# Altium footprint library 排针排座.PcbLib: 344 footprints (part 18 of 22)
Each footprint in its own frame and in the unit in brackets; x right, y up, seen from the top. Pads: shape width x height; smd on the part's side, far side on the other; paste and mask are expansions set on the pad; w line width, h text height; cw(c..) or ccw(c..) is an arc to the next point about the centre after c.
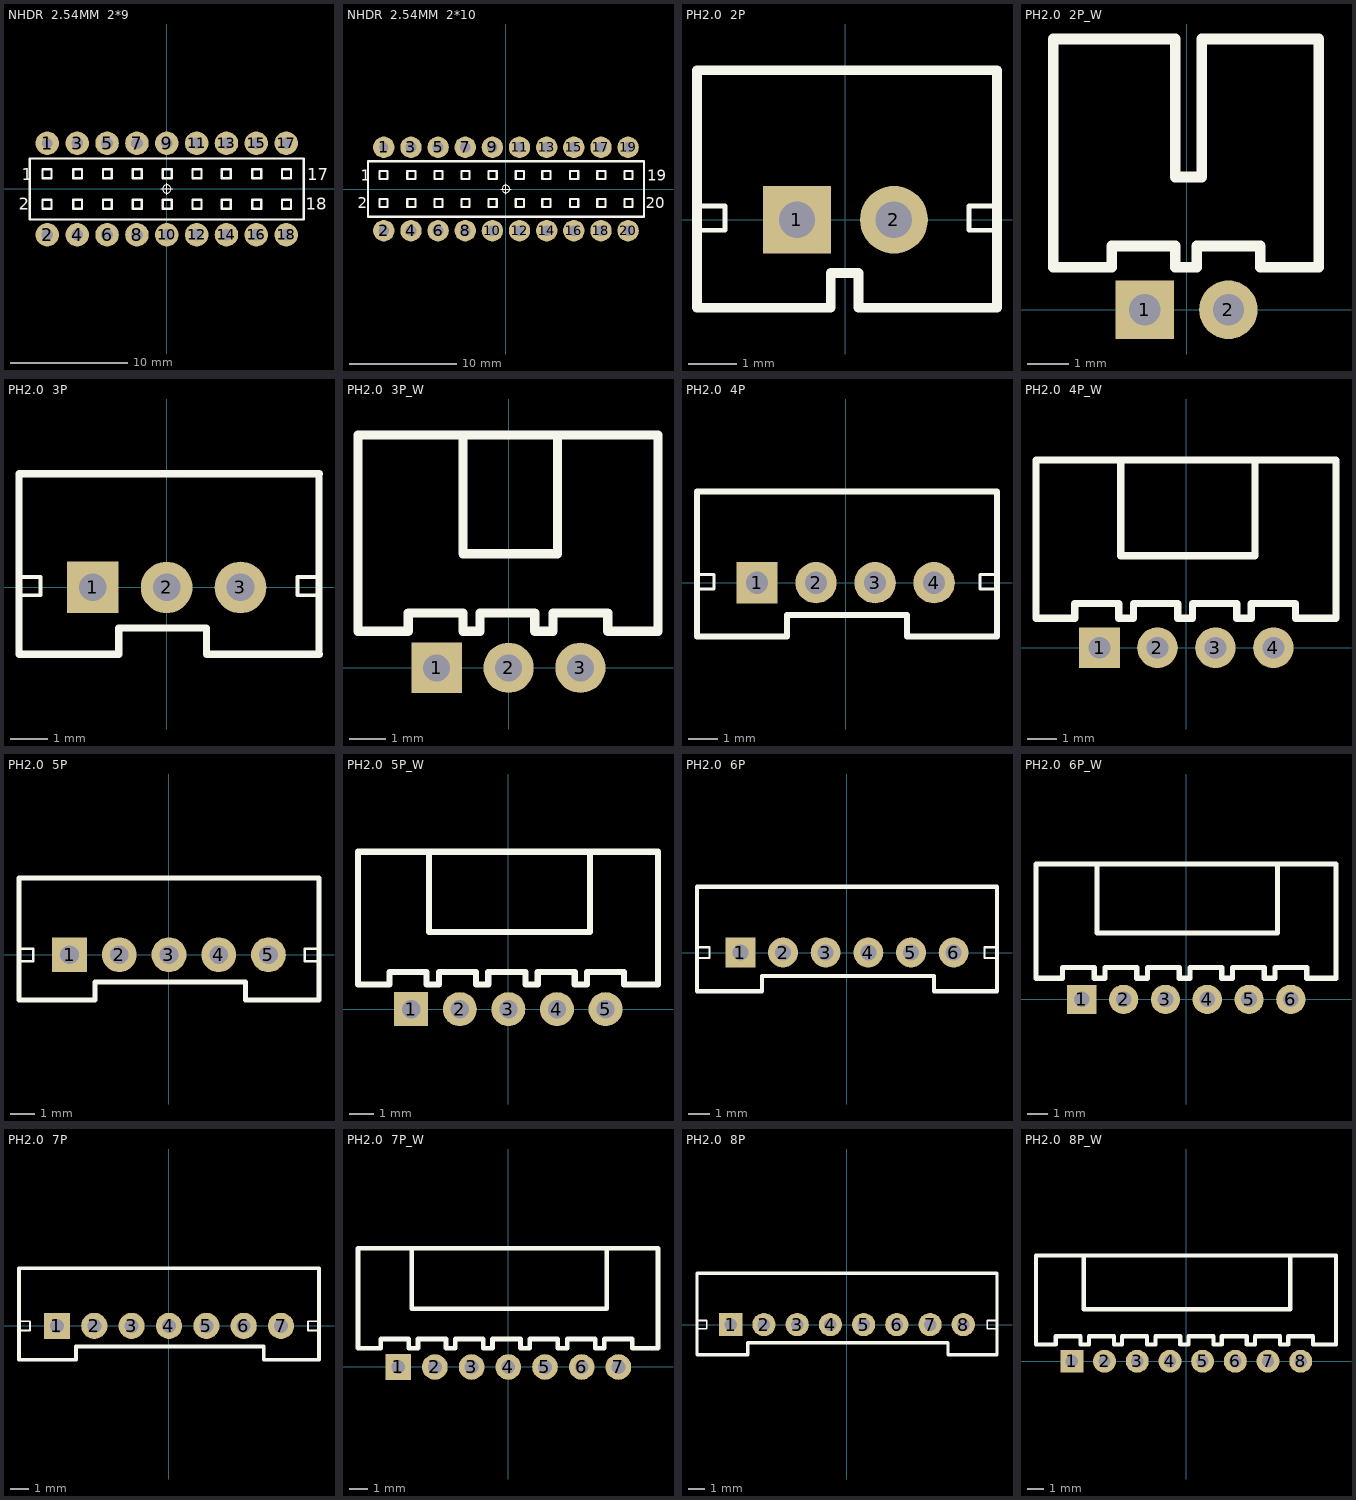
[diagram p17: the footprints below, top view; thin cyan lines are the x and y axes]

## NHDR  2.54MM  2*9 [mm] "脚距：2.54mm，直插双排母"
height 5
pads (18):
  round 2 hole 0.889: 1(-10.16,3.9)
  round 2 hole 1: 2(-10.16,-3.9) 3(-7.62,3.9) 4(-7.62,-3.9) 5(-5.08,3.9) 6(-5.08,-3.9) 7(-2.54,3.9) 8(-2.54,-3.9) 9(0,3.9) 10(0,-3.9) 11(2.54,3.9) 12(2.54,-3.9) 13(5.08,3.9) 14(5.08,-3.9) 15(7.62,3.9) 16(7.62,-3.9) 17(10.16,3.9) 18(10.16,-3.9)
Top Overlay:
  circle w0.05: c0,0 r0.35
  lines w0.05: -0.5,0 0.5,0 ; 0,-0.5 0,0.5
  lines w0.2: -11.65,-2.6 -11.65,2.6 11.65,2.6 11.65,-2.6 -11.65,-2.6 ; -10.571,-1.681 -9.809,-1.681 -9.809,-0.919 -10.571,-0.919 -10.571,-1.681 ; -10.571,0.919 -9.809,0.919 -9.809,1.681 -10.571,1.681 -10.571,0.919 ; -7.971,-1.681 -7.209,-1.681 -7.209,-0.919 -7.971,-0.919 -7.971,-1.681 ; -7.971,0.919 -7.209,0.919 -7.209,1.681 -7.971,1.681 -7.971,0.919 ; -5.431,-1.681 -5.431,-0.919 -4.669,-0.919 -4.669,-1.681 -5.431,-1.681 ; -5.431,0.919 -5.431,1.681 -4.669,1.681 -4.669,0.919 -5.431,0.919 ; -2.891,-1.681 -2.129,-1.681 -2.129,-0.919 -2.891,-0.919 -2.891,-1.681 ; -2.891,0.919 -2.129,0.919 -2.129,1.681 -2.891,1.681 -2.891,0.919 ; -0.351,-1.681 0.411,-1.681 0.411,-0.919 -0.351,-0.919 -0.351,-1.681 ; -0.351,0.919 0.411,0.919 0.411,1.681 -0.351,1.681 -0.351,0.919 ; 2.189,-1.681 2.951,-1.681 2.951,-0.919 2.189,-0.919 2.189,-1.681 ; 2.189,0.919 2.951,0.919 2.951,1.681 2.189,1.681 2.189,0.919 ; 4.669,-1.681 4.669,-0.919 5.431,-0.919 5.431,-1.681 4.669,-1.681 ; 4.669,0.919 4.669,1.681 5.431,1.681 5.431,0.919 4.669,0.919 ; 7.269,-1.681 7.269,-0.919 8.031,-0.919 8.031,-1.681 7.269,-1.681 ; 7.269,0.919 7.269,1.681 8.031,1.681 8.031,0.919 7.269,0.919 ; 9.809,-1.681 10.571,-1.681 10.571,-0.919 9.809,-0.919 9.809,-1.681 ; 9.809,0.919 10.571,0.919 10.571,1.681 9.809,1.681 9.809,0.919
  text "18" at 11.811,-1.778 h1.02
  text "17" at 11.938,0.762 h1.02
  text "2" at -12.573,-1.778 h1.02
  text "1" at -12.319,0.762 h1.02
3D body "NHDR  2.54MM  2-9.step": height 5.3, standoff -3.1, extent -11.65,-3.84 11.65,3.96

## NHDR  2.54MM  2*10 [mm] "脚距：2.54mm，直插双排母"
height 5
pads (20):
  round 2 hole 0.889: 1(-11.43,3.9)
  round 2 hole 1: 2(-11.43,-3.9) 3(-8.89,3.9) 4(-8.89,-3.9) 5(-6.35,3.9) 6(-6.35,-3.9) 7(-3.81,3.9) 8(-3.81,-3.9) 9(-1.27,3.9) 10(-1.27,-3.9) 11(1.27,3.9) 12(1.27,-3.9) 13(3.81,3.9) 14(3.81,-3.9) 15(6.35,3.9) 16(6.35,-3.9) 17(8.89,3.9) 18(8.89,-3.9) 19(11.43,3.9) 20(11.43,-3.9)
Top Overlay:
  circle w0.05: c0,0 r0.35
  lines w0.05: -0.5,0 0.5,0 ; 0,-0.5 0,0.5
  lines w0.2: -12.92,-2.6 -12.92,2.6 12.92,2.6 12.92,-2.6 -12.92,-2.6 ; -11.841,-1.681 -11.841,-0.919 -11.079,-0.919 -11.079,-1.681 -11.841,-1.681 ; -11.841,0.919 -11.841,1.681 -11.079,1.681 -11.079,0.919 -11.841,0.919 ; -9.241,-1.681 -9.241,-0.919 -8.479,-0.919 -8.479,-1.681 -9.241,-1.681 ; -9.241,0.919 -9.241,1.681 -8.479,1.681 -8.479,0.919 -9.241,0.919 ; -6.701,-1.681 -5.939,-1.681 -5.939,-0.919 -6.701,-0.919 -6.701,-1.681 ; -6.701,0.919 -5.939,0.919 -5.939,1.681 -6.701,1.681 -6.701,0.919 ; -4.161,-1.681 -4.161,-0.919 -3.399,-0.919 -3.399,-1.681 -4.161,-1.681 ; -4.161,0.919 -4.161,1.681 -3.399,1.681 -3.399,0.919 -4.161,0.919 ; -1.621,-1.681 -1.621,-0.919 -0.859,-0.919 -0.859,-1.681 -1.621,-1.681 ; -1.621,0.919 -1.621,1.681 -0.859,1.681 -0.859,0.919 -1.621,0.919 ; 0.919,-1.681 0.919,-0.919 1.681,-0.919 1.681,-1.681 0.919,-1.681 ; 0.919,0.919 0.919,1.681 1.681,1.681 1.681,0.919 0.919,0.919 ; 3.399,-1.681 4.161,-1.681 4.161,-0.919 3.399,-0.919 3.399,-1.681 ; 3.399,0.919 4.161,0.919 4.161,1.681 3.399,1.681 3.399,0.919 ; 5.999,-1.681 6.761,-1.681 6.761,-0.919 5.999,-0.919 5.999,-1.681 ; 5.999,0.919 6.761,0.919 6.761,1.681 5.999,1.681 5.999,0.919 ; 8.539,-1.681 8.539,-0.919 9.301,-0.919 9.301,-1.681 8.539,-1.681 ; 8.539,0.919 8.539,1.681 9.301,1.681 9.301,0.919 8.539,0.919 ; 11.079,-1.681 11.841,-1.681 11.841,-0.919 11.079,-0.919 11.079,-1.681 ; 11.079,0.919 11.841,0.919 11.841,1.681 11.079,1.681 11.079,0.919
  text "20" at 13.081,-1.778 h1.02
  text "19" at 13.208,0.762 h1.02
  text "1" at -13.589,0.762 h1.02
  text "2" at -13.843,-1.778 h1.02
3D body "NHDR  2.54MM  2-10.step": height 5.3, standoff -3.1, extent -12.92,-3.9 12.92,3.9

## PH2.0  2P [mm] "接插件/1A"
height 10
pads (2):
  rect 1.4x1.4 hole 0.75: 1(-1,0)
  round 1.4 hole 0.75: 2(1,0)
Top Overlay:
  lines w0.1: -3.064,-0.216 -2.484,-0.216 -2.484,0.284 -3.064,0.284 ; 3.128,-0.216 2.548,-0.216 2.548,0.284 3.128,0.284
  lines w0.2: -3.064,-1.816 -3.064,3.084 ; -0.302,-1.816 -0.302,-1.1 0.27,-1.1 0.27,-1.816 ; 3.128,-1.816 3.128,3.084
  lines w0.203: -3,-1.816 -0.302,-1.816 ; -3,3.084 3.128,3.084 ; 0.27,-1.816 3.128,-1.816
3D body "PH2.0-2P.STEP": height 6.02, standoff -2.98, extent -2.95,-1.7 2.95,3

## PH2.0  2P_W [mm] "接插件/1A"
height 10
pads (2):
  rect 1.4x1.4 hole 0.75: 1(-1,0)
  round 1.4 hole 0.75: 2(1,0)
Top Overlay:
  lines w0.254: -3.191,1.016 -3.191,6.477 -0.27,6.477 -0.27,3.175 0.365,3.175 0.365,6.477 3.159,6.477 3.159,1.016 1.762,1.016 1.762,1.524 0.238,1.524 0.238,1.016 -0.27,1.016 -0.27,1.524 -1.794,1.524 -1.794,1.016 -3.191,1.016
3D body "PH2.0-2P_H.STEP": height 4.72, standoff -2.68, extent -2.95,-0.3 2.95,6.3

## PH2.0  3P [mm] "接插件/1A"
height 10
pads (3):
  rect 1.4x1.4 hole 0.75: 1(-2,0)
  round 1.4 hole 0.75: 2(0,0) 3(2,0)
Top Overlay:
  lines w0.1: -4,-0.216 -3.42,-0.216 -3.42,0.284 -4,0.284 ; 4.128,-0.216 3.548,-0.216 3.548,0.284 4.128,0.284
  lines w0.2: -4,-1.816 -4,3.084 ; -1.302,-1.816 -1.302,-1.1 1.08,-1.1 1.08,-1.816 ; 4.128,-1.816 4.128,3.084
  lines w0.203: -4,-1.816 -1.302,-1.816 ; -4,3.084 4.128,3.084 ; 1.08,-1.816 4.128,-1.816
3D body "PH2.0-3P.STEP": height 6.02, standoff -2.98, extent -3.95,-1.7 3.95,3

## PH2.0  3P_W [mm] "接插件/1A"
height 10
pads (3):
  rect 1.4x1.4 hole 0.75: 1(-2,0)
  round 1.4 hole 0.75: 2(0,0) 3(2,0)
Top Overlay:
  lines w0.254: -1.27,6.477 1.365,6.477 ; -1.27,6.477 -4.191,6.477 -4.191,1.016 -2.794,1.016 -2.794,1.524 -1.27,1.524 -1.27,1.016 -0.794,1.016 -0.794,1.524 0.73,1.524 0.73,1.016 1.238,1.016 1.238,1.524 2.762,1.524 2.762,1.016 4.159,1.016 4.159,6.477 1.365,6.477 ; -1.27,6.477 -1.27,3.175 1.365,3.175 1.365,6.477
3D body "PH2.0-3P_H.STEP": height 4.72, standoff -2.68, extent -3.95,-0.3 3.95,6.3

## PH2.0  4P [mm] "接插件/1A"
height 10
pads (4):
  rect 1.4x1.4 hole 0.75: 1(-3,0)
  round 1.4 hole 0.75: 2(-1,0) 3(1,0) 4(3,0)
Top Overlay:
  lines w0.1: -5.032,-0.216 -4.452,-0.216 -4.452,0.284 -5.032,0.284 ; 5.128,-0.216 4.548,-0.216 4.548,0.284 5.128,0.284
  lines w0.2: -5.032,-1.816 -5.032,3.084 5.128,3.084 5.128,-1.816 ; -1.984,-1.816 -1.984,-1.1 2.08,-1.1 2.08,-1.816
  lines w0.203: -5.032,-1.816 -1.984,-1.816 ; 2.08,-1.816 5.128,-1.816
3D body "PH2.0-4P.STEP": height 6.02, standoff -2.98, extent -4.95,-1.7 4.95,3

## PH2.0  4P_W [mm] "接插件/1A"
height 10
pads (4):
  rect 1.4x1.4 hole 0.75: 1(-3,0)
  round 1.4 hole 0.75: 2(-1,0) 3(1,0) 4(3,0)
Top Overlay:
  lines w0.254: -0.27,6.477 -5.191,6.477 -5.191,1.016 -3.858,1.016 -3.858,1.524 -3.604,1.524 -2.334,1.524 -2.334,1.016 -1.826,1.016 -1.826,1.524 -0.302,1.524 -0.302,1.016 0.206,1.016 0.206,1.524 1.73,1.524 1.73,1.016 2.238,1.016 2.238,1.524 3.762,1.524 3.762,1.016 5.159,1.016 5.159,6.477 2.365,6.477 ; 2.365,6.477 2.365,3.175 -2.27,3.175 -2.27,6.477 2.365,6.477
3D body "PH2.0-4P_H.STEP": height 4.72, standoff -2.68, extent -4.95,-0.3 4.95,6.3

## PH2.0  5P [mm] "接插件/1A"
height 10
pads (5):
  rect 1.4x1.4 hole 0.75: 1(-4,0)
  round 1.4 hole 0.75: 2(-2,0) 3(0,0) 4(2,0) 5(4,0)
Top Overlay:
  lines w0.1: -6.032,-0.254 -5.452,-0.254 -5.452,0.246 -6.032,0.246 ; 6.032,-0.254 5.452,-0.254 5.452,0.246 6.032,0.246
  lines w0.2: -6.032,-1.816 -6.032,3.084 6.032,3.084 6.032,-1.816 ; -2.984,-1.816 -2.984,-1.1 3.08,-1.1 3.08,-1.816
  lines w0.203: -6.032,-1.816 -2.984,-1.816 ; 3.08,-1.816 6.032,-1.816
3D body "PH2.0-5P.STEP": height 6.02, standoff -2.98, extent -5.95,-1.7 5.95,3

## PH2.0  5P_W [mm] "接插件/1A"
height 10
pads (5):
  rect 1.4x1.4 hole 0.75: 1(-4,0)
  round 1.4 hole 0.75: 2(-2,0) 3(0,0) 4(2,0) 5(4,0)
Top Overlay:
  lines w0.254: 0.73,6.477 -6.191,6.477 -6.191,1.016 -4.89,1.016 -4.89,1.524 -4.636,1.524 -3.366,1.524 -3.366,1.016 -2.858,1.016 -2.858,1.524 -1.334,1.524 -1.334,1.016 -0.826,1.016 -0.826,1.524 0.698,1.524 0.698,1.016 1.206,1.016 1.206,1.524 2.73,1.524 2.73,1.016 3.238,1.016 3.238,1.524 4.762,1.524 4.762,1.016 6.159,1.016 6.159,6.477 3.365,6.477 ; 3.365,6.477 -3.27,6.477 -3.27,3.175 3.365,3.175 3.365,6.477
3D body "PH2.0-5P_H.STEP": height 4.72, standoff -2.68, extent -5.95,-0.3 5.95,6.3

## PH2.0  6P [mm] "接插件/1A"
height 10
pads (6):
  rect 1.4x1.4 hole 0.75: 1(-5,0)
  round 1.4 hole 0.75: 2(-3,0) 3(-1,0) 4(1,0) 5(3,0) 6(5,0)
Top Overlay:
  lines w0.1: -7.032,-0.254 -6.452,-0.254 -6.452,0.246 -7.032,0.246 ; 7.032,-0.254 6.452,-0.254 6.452,0.246 7.032,0.246
  lines w0.2: -7.032,-1.816 -7.032,3.084 7.032,3.084 7.032,-1.816 ; -3.984,-1.816 -3.984,-1.1 4.08,-1.1 4.08,-1.816
  lines w0.203: -7.032,-1.816 -3.984,-1.816 ; 4.08,-1.816 7.032,-1.816
3D body "PH2.0-6P.STEP": height 6.02, standoff -2.98, extent -6.95,-1.7 6.95,3

## PH2.0  6P_W [mm] "接插件/1A"
height 10
pads (6):
  rect 1.4x1.4 hole 0.75: 1(-5,0)
  round 1.4 hole 0.75: 2(-3,0) 3(-1,0) 4(1,0) 5(3,0) 6(5,0)
Top Overlay:
  lines w0.254: 1.73,6.477 -7.191,6.477 -7.191,1.016 -5.922,1.016 -5.922,1.524 -4.398,1.524 -4.398,1.016 -3.89,1.016 -3.89,1.524 -2.366,1.524 -2.366,1.016 -1.858,1.016 -1.858,1.524 -0.334,1.524 -0.334,1.016 0.174,1.016 0.174,1.524 1.698,1.524 1.698,1.016 2.206,1.016 2.206,1.524 3.73,1.524 3.73,1.016 4.238,1.016 4.238,1.524 5.762,1.524 5.762,1.016 7.159,1.016 7.159,6.477 4.365,6.477 ; 4.365,6.477 -4.27,6.477 -4.27,3.175 4.365,3.175 4.365,6.477
3D body "PH2.0-6P_H.STEP": height 4.72, standoff -2.68, extent -6.95,-0.3 6.95,6.3

## PH2.0  7P [mm] "接插件/1A"
height 10
pads (7):
  rect 1.4x1.4 hole 0.75: 1(-6,0)
  round 1.4 hole 0.75: 2(-4,0) 3(-2,0) 4(0,0) 5(2,0) 6(4,0) 7(6,0)
Top Overlay:
  lines w0.1: -8.032,-0.254 -7.452,-0.254 -7.452,0.246 -8.032,0.246 ; 8.032,-0.254 7.452,-0.254 7.452,0.246 8.032,0.246
  lines w0.2: -8.032,-1.816 -8.032,3.084 8.032,3.084 8.032,-1.816 ; -4.984,-1.816 -4.984,-1.1 5.08,-1.1 5.08,-1.816
  lines w0.203: -8.032,-1.816 -4.984,-1.816 ; 5.08,-1.816 8.032,-1.816
3D body "PH2.0-7P.STEP": height 6.02, standoff -2.98, extent -7.95,-1.7 7.95,3

## PH2.0  7P_W [mm] "接插件/1A"
height 10
pads (7):
  rect 1.4x1.4 hole 0.75: 1(-6,0)
  round 1.4 hole 0.75: 2(-4,0) 3(-2,0) 4(0,0) 5(2,0) 6(4,0) 7(6,0)
Top Overlay:
  lines w0.254: 2.73,6.477 -8.191,6.477 -8.191,1.016 -6.954,1.016 -6.954,1.524 -5.43,1.524 -5.43,1.016 -4.922,1.016 -4.922,1.524 -3.398,1.524 -3.398,1.016 -2.89,1.016 -2.89,1.524 -1.366,1.524 -1.366,1.016 -0.858,1.016 -0.858,1.524 -0.604,1.524 0.666,1.524 0.666,1.016 1.174,1.016 1.174,1.524 2.698,1.524 2.698,1.016 3.206,1.016 3.206,1.524 4.73,1.524 4.73,1.016 5.238,1.016 5.238,1.524 6.762,1.524 6.762,1.016 8.159,1.016 8.159,6.477 5.365,6.477 ; 5.365,6.477 5.365,3.175 -5.27,3.175 -5.27,6.477 5.365,6.477
3D body "PH2.0-7P_H.STEP": height 4.72, standoff -2.68, extent -7.95,-0.3 7.95,6.3

## PH2.0  8P [mm] "接插件/1A"
height 10
pads (8):
  rect 1.4x1.4 hole 0.75: 1(-7,0)
  round 1.4 hole 0.75: 2(-5,0) 3(-3,0) 4(-1,0) 5(1,0) 6(3,0) 7(5,0) 8(7,0)
Top Overlay:
  lines w0.1: -9.032,-0.254 -8.452,-0.254 -8.452,0.246 -9.032,0.246 ; 9.032,-0.254 8.452,-0.254 8.452,0.246 9.032,0.246
  lines w0.2: -9.032,-1.816 -9.032,3.084 9.032,3.084 9.032,-1.816 ; -5.984,-1.816 -5.984,-1.1 6.08,-1.1 6.08,-1.816
  lines w0.203: -9.032,-1.816 -5.984,-1.816 ; 6.08,-1.816 9.032,-1.816
3D body "PH2.0-8P.STEP": height 6.02, standoff -2.98, extent -8.95,-1.7 8.95,3

## PH2.0  8P_W [mm] "接插件/1A"
height 10
pads (8):
  rect 1.4x1.4 hole 0.75: 1(-7,0)
  round 1.4 hole 0.75: 2(-5,0) 3(-3,0) 4(-1,0) 5(1,0) 6(3,0) 7(5,0) 8(7,0)
Top Overlay:
  lines w0.254: -6.27,6.477 -6.27,3.175 6.365,3.175 6.365,6.477 ; -4.27,6.477 6.365,6.477 ; 3.73,6.477 -9.191,6.477 -9.191,1.016 -7.986,1.016 -7.986,1.524 -6.462,1.524 -6.462,1.016 -5.954,1.016 -5.954,1.524 -4.43,1.524 -4.43,1.016 -3.922,1.016 -3.922,1.524 -2.398,1.524 -2.398,1.016 -1.89,1.016 -1.89,1.524 -0.366,1.524 -0.366,1.016 0.142,1.016 0.142,1.524 1.666,1.524 1.666,1.016 2.174,1.016 2.174,1.524 3.698,1.524 3.698,1.016 4.206,1.016 4.206,1.524 5.73,1.524 5.73,1.016 6.238,1.016 6.238,1.524 7.762,1.524 7.762,1.016 9.159,1.016 9.159,6.477 6.365,6.477
3D body "PH2.0-8P_H.STEP": height 4.72, standoff -2.68, extent -8.95,-0.3 8.95,6.3